# Altium footprint library lib.PcbLib: 145 footprints (part 3 of 10)
Each footprint in its own frame and in the unit in brackets; x right, y up, seen from the top. Pads: shape width x height; smd on the part's side, far side on the other; paste and mask are expansions set on the pad; w line width, h text height; cw(c..) or ccw(c..) is an arc to the next point about the centre after c.
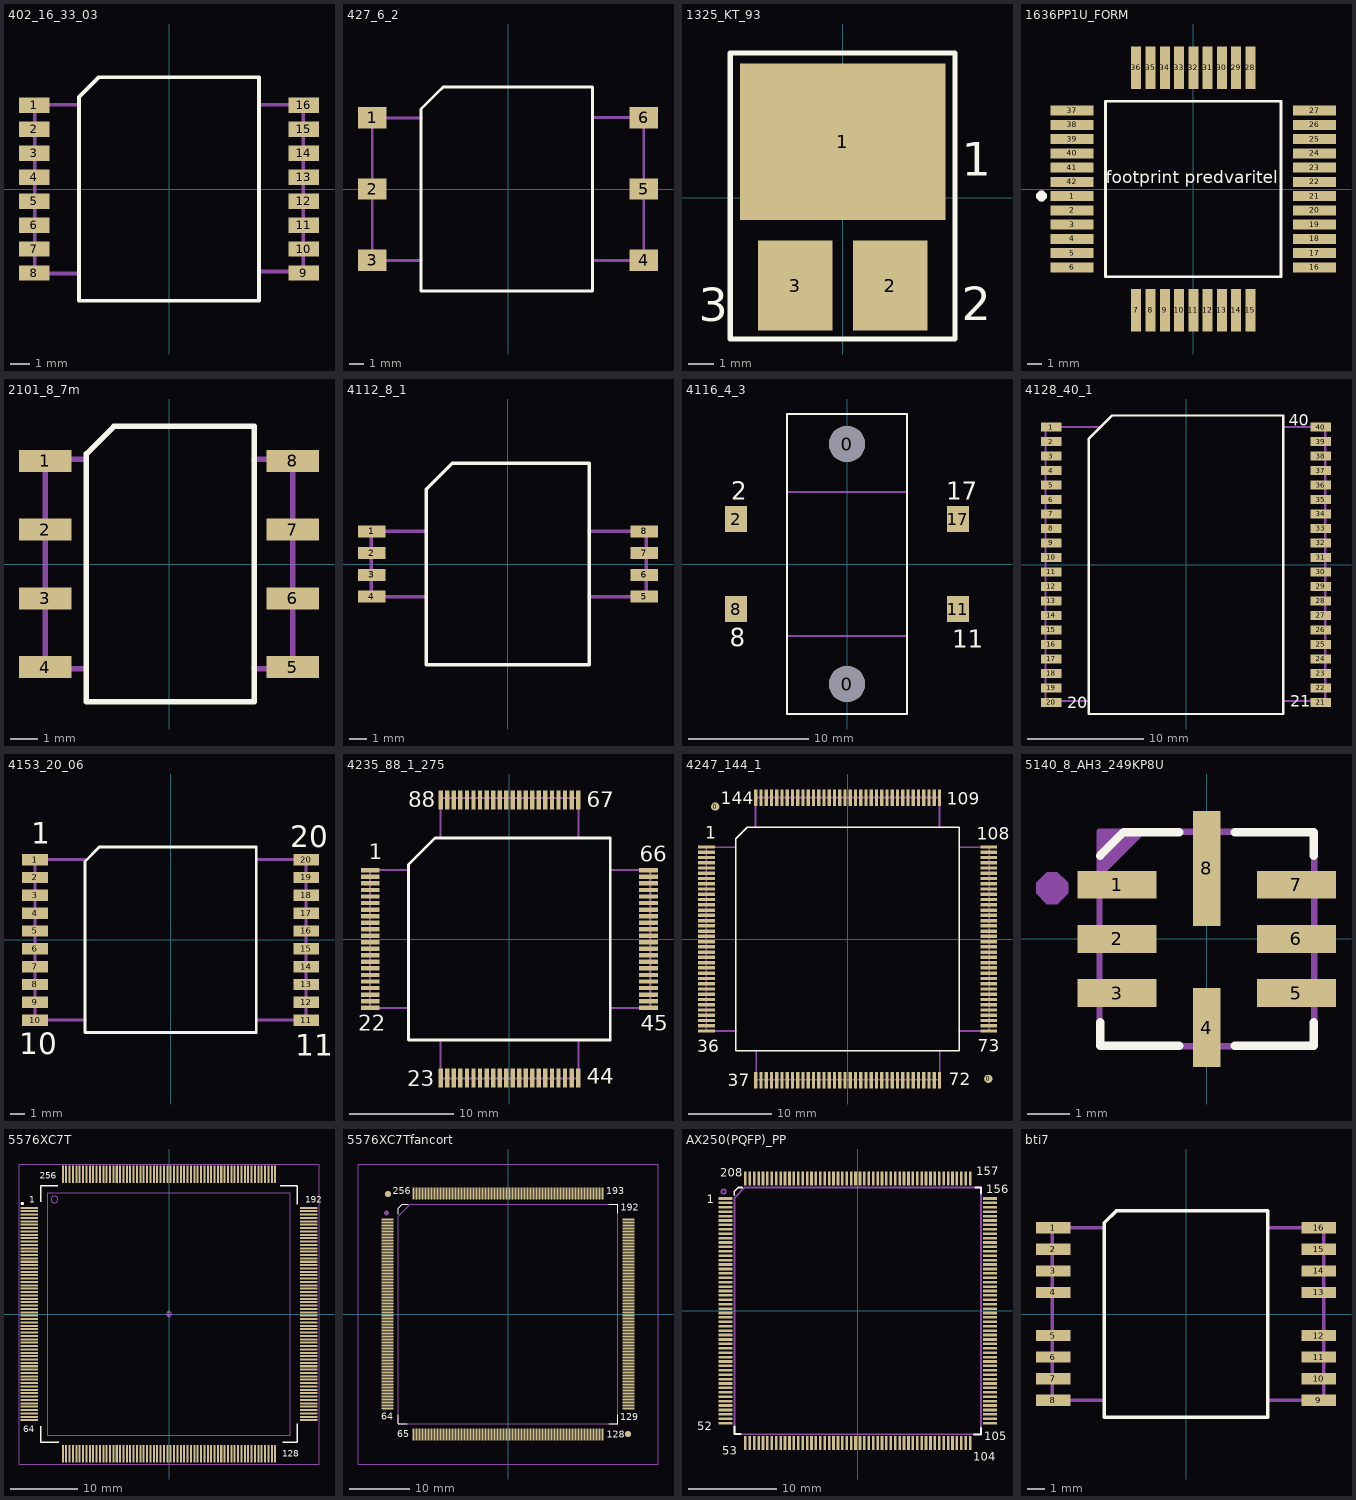
[diagram p2: the footprints below, top view; thin cyan lines are the x and y axes]

## 402_16_33_03 [mm] "m2g"
height 2.5
pads (16):
  rect 1.6x0.8 smd: 1(-7.025,4.375) 2(-7.025,3.125) 3(-7.025,1.875) 4(-7.025,0.625) 5(-7.025,-0.625) 6(-7.025,-1.875) 7(-7.025,-3.125) 8(-7.025,-4.375) 9(7.025,-4.375) 10(7.025,-3.125) 11(7.025,-1.875) 12(7.025,-0.625) 13(7.025,0.625) 14(7.025,1.875) 15(7.025,3.125) 16(7.025,4.375)
Top Overlay:
  lines w0.2: -4.7,-5.825 -4.7,4.8 -3.658,5.842 4.7,5.842 4.7,-5.825 -4.7,-5.825
Mechanical 5:
  lines w0.2: -4.7,-4.4 -7,-4.4 -7,4.4 -4.7,4.4 ; 4.7,-4.3 7,-4.3 7,4.1 7,4.4 4.7,4.4
Mechanical 25:
  text "9" at 5,-5 h2
  text "16" at 4,3.75 h2
  text "8" at -5.75,-5 h2
  text "1" at -5.75,3.75 h2
3D body "CFP125P1440X250-16N.step": height 2.5, standoff 0, extent -7.25,-5.825 7.25,5.825

## 427_6_2 [mm] "286ЕП5"
height 5.6
pads (6):
  rect 2x1.5 smd: 1(-9.5,5) 2(-9.5,0) 3(-9.5,-5) 4(9.5,-5) 5(9.5,0) 6(9.5,5)
Top Overlay:
  lines w0.2: -6.087,-7.15 -6.087,5.6 -5.7,5.988 -4.925,6.763 -4.537,7.15 5.913,7.15 5.913,-7.15 -6.062,-7.15
Mechanical 5:
  lines w0.2: -6.1,-5 -9.5,-5 -9.5,4.975 -6.075,4.975 ; 5.9,5 9.5,5 9.5,-5 5.925,-5
Mechanical 25:
  text "1" at -7.875,4.45 h2
  text "6" at 7.175,4.35 h2
  text "4" at 7,-5.775 h2
  text "3" at -7.925,-5.525 h2

## 1325_KT_93 [mm]
height 3.05
pads (3):
  rect 8x6.1 smd: 1(0,2.175)
  rect 2.9x3.5 smd: 2(1.85,-3.425) 3(-1.85,-3.425)
Top Overlay:
  lines w0.2: -4.375,-5.5 -4.375,-5.125 -4.375,5.625 -4,5.625 4.375,5.625 4.375,5.25 4.375,-5.5 3,-5.5 -4.375,-5.5
  text "3" at -5.6,-4.8 h1.31
  text "2" at 4.625,-4.775 h1.31
  text "1" at 4.625,0.85 h1.31
Top Paste:
  region: -1.5,-0.625 -1.5,1.875 -3.625,1.875 -3.625,-0.625
  region: 1.5,1.875 1.5,-0.625 3.625,-0.625 3.625,1.875
  region: -3.625,2.25 -1.5,2.25 -1.5,4.875 -3.625,4.875
  region: 3.625,2.25 3.625,4.875 1.5,4.875 1.5,2.25
  region: 1.125,-0.625 1.125,1.875 -1.125,1.875 -1.125,-0.625
  region: 1.125,2.25 1.125,4.875 -1.125,4.875 -1.125,2.25
Mechanical 25:
  text "1" at 4.625,2.55 h2
  text "2" at 4.5,-3.2 h2
  text "3" at -5.2,-3.2 h2
3D body: height 0.4, standoff 0, extent -3.65,-0.85 3.65,4.85
3D body: height 0.4, standoff 0, extent -2.95,-4.8 -0.45,-1.7
3D body: height 0.4, standoff 0, extent 0.45,-4.8 2.95,-1.7
3D body: height 2.6, standoff 0.4, extent -3.7,-5.1 3.9,5.1

## 1636PP1U_FORM [mm]
pads (42):
  rect 3x0.7 smd: 1(-8.5,-0.5) 2(-8.5,-1.5) 3(-8.5,-2.5) 4(-8.5,-3.5) 5(-8.5,-4.5) 6(-8.5,-5.5) 16(8.5,-5.5) 17(8.5,-4.5) 18(8.5,-3.5) 19(8.5,-2.5) 20(8.5,-1.5) 21(8.5,-0.5) 22(8.5,0.5) 23(8.5,1.5) 24(8.5,2.5) 25(8.5,3.5) 26(8.5,4.5) 27(8.5,5.5) 37(-8.5,5.5) 38(-8.5,4.5) 39(-8.5,3.5) 40(-8.5,2.5) 41(-8.5,1.5) 42(-8.5,0.5)
  rect 0.7x3 smd: 7(-4,-8.5) 8(-3,-8.5) 9(-2,-8.5) 10(-1,-8.5) 11(0,-8.5) 12(1,-8.5) 13(2,-8.5) 14(3,-8.5) 15(4,-8.5) 28(4,8.5) 29(3,8.5) 30(2,8.5) 31(1,8.5) 32(0,8.5) 33(-1,8.5) 34(-2,8.5) 35(-3,8.5) 36(-4,8.5)
Top Overlay:
  region: -11.025,-0.61 -10.775,-0.86 -10.525,-0.86 -10.275,-0.61 -10.275,-0.36 -10.525,-0.11 -10.775,-0.11 -11.025,-0.36
  lines w0.2: -6.15,-6.15 6.15,-6.15 6.15,6.15 -6.15,6.15 -6.15,-6.15
  text "footprint predvaritel" at -6.15,0.1 h1.5
Mechanical 25:
  region: -11.025,-0.61 -10.775,-0.86 -10.525,-0.86 -10.275,-0.61 -10.275,-0.36 -10.525,-0.11 -10.775,-0.11 -11.025,-0.36
  text "6" at -9.05,-7.75 h2
  text "7" at -6,-9.3 h2
  text "15" at 5,-9.2 h2
  text "16" at 7.725,-8 h2
  text "27" at 7.525,6.225 h2
  text "28" at 4.975,8.1 h2
  text "36" at -6.9,8.05 h2
  text "37" at -9.625,6.25 h2
  text "1" at -11.725,-1.175 h2

## 2101_8_7m [mm]
height 5.5
pads (8):
  rect 1.9x0.8 smd: 1(-4.5,3.75) 2(-4.5,1.25) 3(-4.5,-1.25) 4(-4.5,-3.75) 5(4.5,-3.75) 6(4.5,-1.25) 7(4.5,1.25) 8(4.5,3.75)
Top Overlay:
  lines w0.2: -3,-5 3.1,-5 3.1,5 -2,5 -3,4 -3,-5
Mechanical 5:
  lines w0.2: -3.1,-3.8 -4.5,-3.8 -4.5,3.8 -3.1,3.8 ; 3.1,-3.8 4.5,-3.8 4.5,3.8 3.1,3.8
Mechanical 25:
  text "8" at 2.25,3.25 h2
  text "1" at -3,3.25 h2
  text "4" at -3.25,-4.25 h2
  text "5" at 2.25,-4.25 h2
3D body "2101_8_7m.stp": height 5.6, standoff -0.15, extent -4.875,-5 4.925,5

## 4112_8_1 [mm] "34;44.3276.163.12   (ОСМ5559ИН2АТ???????)"
height 2.45
pads (8):
  rect 1.6x0.7 smd: 1(-7.85,1.875) 2(-7.85,0.625) 3(-7.85,-0.625) 4(-7.85,-1.875) 5(7.85,-1.875) 6(7.85,-0.625) 7(7.85,0.625) 8(7.85,1.875)
Top Overlay:
  lines w0.2: -4.725,-5.8 -4.725,4.3 -3.225,5.8 4.675,5.8 4.675,-5.8 -4.725,-5.8
Mechanical 5:
  lines w0.2: -7.925,-1.9 -4.725,-1.9 ; -7.925,1.9 -4.725,1.9 ; -7.875,-1.9 -7.875,1.9 ; 4.675,-1.9 7.975,-1.9 7.975,1.9 4.675,1.9
Mechanical 25:
  text "8" at 5.575,1 h3
  text "5" at 5.575,-2.9 h3
  text "4" at -6.725,-2.9 h3
  text "1" at -6.625,0.9 h3

## 4116_4_3 [mm] "Install 35 massa 3 form 44.3242.193.xx"
height 3.35
pads (6):
  round 3 hole 3 unplated: 0(0,-10) 0(0,10)
  rect 1.8x2.2 smd: 2(-9.25,3.75) 8(-9.25,-3.75) 11(9.25,-3.75) 17(9.25,3.75)
Top Overlay:
  lines w0.2: -5,-12.5 -5,12.5 5,12.5 5,-12.5 -5,-12.5
  text "8" at -9.779,-6.858 h1.5
  text "2" at -9.652,5.334 h1.5
  text "11" at 8.763,-6.985 h1.5
  text "17" at 8.255,5.334 h1.5
Top Solder:
  circle w1.5: c0,-10 r0.75
  circle w1.5: c0,10 r0.75
Bottom Solder:
  circle w1.5: c0,-10 r0.75
  circle w1.5: c0,10 r0.75
Mechanical 5:
  lines w0.2: -5,5.9 -5,-6 5,-6 ; -5,6 5,6 5,-5.9
Mechanical 25:
  text "17" at 6.2,3.2 h2
  text "2" at -7.625,3.175 h2
  text "8" at -7.625,-4.35 h2
  text "11" at 6.2,-4.6 h2

## 4128_40_1 [mm] "1667PA014, 44.0000.238.16???"
height 3.1
pads (40):
  rect 1.8x0.8 smd: 1(-11.625,11.875) 2(-11.625,10.625) 3(-11.625,9.375) 4(-11.625,8.125) 5(-11.625,6.875) 6(-11.625,5.625) 7(-11.625,4.375) 8(-11.625,3.125) 9(-11.625,1.875) 10(-11.625,0.625) 11(-11.625,-0.625) 12(-11.625,-1.875) 13(-11.625,-3.125) 14(-11.625,-4.375) 15(-11.625,-5.625) 16(-11.625,-6.875) 17(-11.625,-8.125) 18(-11.625,-9.375) 19(-11.625,-10.625) 20(-11.625,-11.875) 21(11.625,-11.875) 22(11.625,-10.625) 23(11.625,-9.375) 24(11.625,-8.125) 25(11.625,-6.875) 26(11.625,-5.625) 27(11.625,-4.375) 28(11.625,-3.125) 29(11.625,-1.875) 30(11.625,-0.625) 31(11.625,0.625) 32(11.625,1.875) 33(11.625,3.125) 34(11.625,4.375) 35(11.625,5.625) 36(11.625,6.875) 37(11.625,8.125) 38(11.625,9.375) 39(11.625,10.625) 40(11.625,11.875)
Top Overlay:
  lines w0.2: -8.375,-12.875 -8.375,10.875 -6.375,12.875 8.375,12.875 8.375,-12.875 -8.375,-12.875
  text "21" at 9,-12.25 h1
  text "40" at 8.875,12 h1
  text "20" at -10.25,-12.375 h1
Mechanical 5:
  lines w0.2: -8.375,-11.75 -12.125,-11.75 -12.125,11.875 -7.5,11.875 ; 8.375,-11.75 12,-11.75 12,11.875 8.5,11.875
Mechanical 25:
  text "40" at 8.625,11.375 h2
  text "21" at 8.625,-12.375 h2
  text "20" at -10.25,-12.375 h2
  text "1" at -9.8,11.2 h2
3D body "CFP125P2370X310-40N.step": height 3.1, standoff 0, extent -11.9,-12.7 11.9,12.7

## 4153_20_06 [mm] "1564ИР33Т ЭП"
height 3
pads (20):
  rect 1.8x0.8 smd: 1(-9.5,5.625) 2(-9.5,4.375) 3(-9.5,3.125) 4(-9.5,1.875) 5(-9.5,0.625) 6(-9.5,-0.625) 7(-9.5,-1.875) 8(-9.5,-3.125) 9(-9.5,-4.375) 10(-9.5,-5.625) 11(9.5,-5.625) 12(9.5,-4.375) 13(9.5,-3.125) 14(9.5,-1.875) 15(9.5,-0.625) 16(9.5,0.625) 17(9.5,1.875) 18(9.5,3.125) 19(9.5,4.375) 20(9.5,5.625)
Top Overlay:
  lines w0.2: -6,-6.5 -6,5.5 -5,6.5 6,6.5 6,-6.5 -6,-6.5
  text "20" at 8.375,6.5 h1.5
  text "11" at 8.75,-8.125 h1.5
  text "10" at -10.625,-8 h1.5
  text "1" at -9.75,6.75 h1.5
Mechanical 5:
  lines w0.2: -6,-5.625 -9.5,-5.625 -9.5,5.625 -6,5.625 ; 6,-5.625 9.5,-5.625 9.5,5.625 6,5.625
Mechanical 25:
  text "20" at 6.2,4.975 h2
  text "11" at 6.45,-6.325 h2
  text "10" at -7.875,-6.25 h2
  text "1" at -7.675,4.95 h2
3D body "CFP125P1920X300-20N.step": height 3, standoff 0, extent -9.65,-6.5 9.65,6.5

## 4235_88_1_275 [mm] "1874ВЕ7Т   m4.5g"
height 3.1
pads (88):
  rect 1.8x0.42 smd: 1(-13.3,6.562) 2(-13.3,5.937) 3(-13.3,5.312) 4(-13.3,4.687) 5(-13.3,4.062) 6(-13.3,3.437) 7(-13.3,2.812) 8(-13.3,2.187) 9(-13.3,1.562) 10(-13.3,0.937) 11(-13.3,0.312) 12(-13.3,-0.312) 13(-13.3,-0.937) 14(-13.3,-1.562) 15(-13.3,-2.187) 16(-13.3,-2.812) 17(-13.3,-3.437) 18(-13.3,-4.062) 19(-13.3,-4.687) 20(-13.3,-5.312) 21(-13.3,-5.937) 22(-13.3,-6.562) 45(13.3,-6.562) 46(13.3,-5.937) 47(13.3,-5.312) 48(13.3,-4.687) 49(13.3,-4.062) 50(13.3,-3.437) 51(13.3,-2.812) 52(13.3,-2.187) 53(13.3,-1.562) 54(13.3,-0.937) 55(13.3,-0.312) 56(13.3,0.312) 57(13.3,0.937) 58(13.3,1.562) 59(13.3,2.187) 60(13.3,2.812) 61(13.3,3.437) 62(13.3,4.062) 63(13.3,4.687) 64(13.3,5.312) 65(13.3,5.937) 66(13.3,6.562)
  rect 0.42x1.8 smd: 23(-6.562,-13.3) 24(-5.937,-13.3) 25(-5.312,-13.3) 26(-4.687,-13.3) 27(-4.062,-13.3) 28(-3.437,-13.3) 29(-2.812,-13.3) 30(-2.187,-13.3) 31(-1.562,-13.3) 32(-0.937,-13.3) 33(-0.312,-13.3) 34(0.312,-13.3) 35(0.937,-13.3) 36(1.562,-13.3) 37(2.187,-13.3) 38(2.812,-13.3) 39(3.437,-13.3) 40(4.062,-13.3) 41(4.687,-13.3) 42(5.312,-13.3) 43(5.937,-13.3) 44(6.562,-13.3) 67(6.562,13.3) 68(5.937,13.3) 69(5.312,13.3) 70(4.687,13.3) 71(4.062,13.3) 72(3.437,13.3) 73(2.812,13.3) 74(2.187,13.3) 75(1.562,13.3) 76(0.937,13.3) 77(0.312,13.3) 78(-0.312,13.3) 79(-0.937,13.3) 80(-1.562,13.3) 81(-2.187,13.3) 82(-2.812,13.3) 83(-3.437,13.3) 84(-4.062,13.3) 85(-4.687,13.3) 86(-5.312,13.3) 87(-5.937,13.3) 88(-6.562,13.3)
Top Overlay:
  lines w0.25: -9.65,-9.65 -9.65,7.114 -7.114,9.65 9.65,9.65 9.65,-9.65 -9.65,-9.65
  text "23" at -9.779,-14.097 h1.5
  text "88" at -9.652,12.573 h1.5
  text "44" at 7.366,-13.843 h1.5
  text "67" at 7.366,12.573 h1.5
  text "1" at -13.462,7.62 h1.5
  text "45" at 12.573,-8.763 h1.5
  text "66" at 12.446,7.366 h1.5
  text "22" at -14.478,-8.763 h1.5
Mechanical 5:
  lines w0.2: -9.652,-6.604 -13.335,-6.604 -13.335,6.604 -9.652,6.604 ; -6.604,-9.652 -6.604,-13.335 6.604,-13.335 6.604,-9.652 ; -6.604,9.652 -6.604,13.462 6.604,13.462 6.604,9.652 ; 9.652,-6.604 13.462,-6.604 13.462,6.604 9.652,6.604
Mechanical 25:
  text "22" at -14.351,-8.509 h2
  text "66" at 12.573,7.62 h2
  text "45" at 12.7,-8.509 h2
  text "1" at -13.335,7.874 h2
  text "67" at 7.493,12.827 h2
  text "44" at 7.493,-13.589 h2
  text "88" at -9.525,12.827 h2
  text "23" at -9.652,-13.843 h2
3D body "CQFP127P600-8N.step": height 3.1, standoff 0, extent -13.75,-13.75 13.75,13.75

## 4247_144_1 [mm] "35а;44ж.3803.346.60;"
height 3.3
pads (146):
  round 1 smd mask+1: 0(-16,16) 0(17,-16.9)
  rect 2x0.4 smd: 1(-17.05,11.112) 2(-17.05,10.477) 3(-17.05,9.842) 4(-17.05,9.207) 5(-17.05,8.572) 6(-17.05,7.938) 7(-17.05,7.302) 8(-17.05,6.667) 9(-17.05,6.032) 10(-17.05,5.397) 11(-17.05,4.763) 12(-17.05,4.127) 13(-17.05,3.492) 14(-17.05,2.857) 15(-17.05,2.222) 16(-17.05,1.587) 17(-17.05,0.953) 18(-17.05,0.318) 19(-17.05,-0.318) 20(-17.05,-0.953) 21(-17.05,-1.587) 22(-17.05,-2.222) 23(-17.05,-2.857) 24(-17.05,-3.492) 25(-17.05,-4.127) 26(-17.05,-4.763) 27(-17.05,-5.397) 28(-17.05,-6.032) 29(-17.05,-6.667) 30(-17.05,-7.302) 31(-17.05,-7.938) 32(-17.05,-8.572) 33(-17.05,-9.207) 34(-17.05,-9.842) 35(-17.05,-10.477) 36(-17.05,-11.112) 73(17.05,-11.112) 74(17.05,-10.477) 75(17.05,-9.842) 76(17.05,-9.207) 77(17.05,-8.572) 78(17.05,-7.938) 79(17.05,-7.302) 80(17.05,-6.667) 81(17.05,-6.032) 82(17.05,-5.397) 83(17.05,-4.763) 84(17.05,-4.127) 85(17.05,-3.492) 86(17.05,-2.857) 87(17.05,-2.222) 88(17.05,-1.587) 89(17.05,-0.953) 90(17.05,-0.318) 91(17.05,0.318) 92(17.05,0.953) 93(17.05,1.587) 94(17.05,2.222) 95(17.05,2.857) 96(17.05,3.492) 97(17.05,4.127) 98(17.05,4.763) 99(17.05,5.397) 100(17.05,6.032) 101(17.05,6.667) 102(17.05,7.302) 103(17.05,7.938) 104(17.05,8.572) 105(17.05,9.207) 106(17.05,9.842) 107(17.05,10.477) 108(17.05,11.112)
  rect 0.4x2 smd: 37(-11.112,-17.05) 38(-10.477,-17.05) 39(-9.842,-17.05) 40(-9.207,-17.05) 41(-8.572,-17.05) 42(-7.938,-17.05) 43(-7.302,-17.05) 44(-6.667,-17.05) 45(-6.032,-17.05) 46(-5.397,-17.05) 47(-4.763,-17.05) 48(-4.127,-17.05) 49(-3.492,-17.05) 50(-2.857,-17.05) 51(-2.222,-17.05) 52(-1.587,-17.05) 53(-0.953,-17.05) 54(-0.318,-17.05) 55(0.318,-17.05) 56(0.953,-17.05) 57(1.587,-17.05) 58(2.222,-17.05) 59(2.857,-17.05) 60(3.492,-17.05) 61(4.127,-17.05) 62(4.763,-17.05) 63(5.397,-17.05) 64(6.032,-17.05) 65(6.667,-17.05) 66(7.302,-17.05) 67(7.938,-17.05) 68(8.572,-17.05) 69(9.207,-17.05) 70(9.842,-17.05) 71(10.477,-17.05) 72(11.112,-17.05) 109(11.112,17.05) 110(10.477,17.05) 111(9.842,17.05) 112(9.207,17.05) 113(8.572,17.05) 114(7.938,17.05) 115(7.302,17.05) 116(6.667,17.05) 117(6.032,17.05) 118(5.397,17.05) 119(4.763,17.05) 120(4.127,17.05) 121(3.492,17.05) 122(2.857,17.05) 123(2.222,17.05) 124(1.587,17.05) 125(0.953,17.05) 126(0.318,17.05) 127(-0.318,17.05) 128(-0.953,17.05) 129(-1.587,17.05) 130(-2.222,17.05) 131(-2.857,17.05) 132(-3.492,17.05) 133(-4.127,17.05) 134(-4.763,17.05) 135(-5.397,17.05) 136(-6.032,17.05) 137(-6.667,17.05) 138(-7.302,17.05) 139(-7.938,17.05) 140(-8.572,17.05) 141(-9.207,17.05) 142(-9.842,17.05) 143(-10.477,17.05) 144(-11.112,17.05)
Top Overlay:
  lines w0.2: -13.5,-13.5 -13.5,12.125 -12.125,13.5 13.5,13.5 13.5,-13.5 -13.5,-13.5
  text "1" at -17.2,12.1 h1.5
  text "36" at -18.2,-13.7 h1.5
  text "37" at -14.5,-17.8 h1.5
  text "72" at 12.2,-17.7 h1.5
  text "73" at 15.7,-13.6 h1.5
  text "108" at 15.6,12 h1.5
  text "109" at 12,16.2 h1.5
  text "144" at -15.3,16.3 h1.5
Mechanical 5:
  lines w0.2: -13.525,11.1 -17.075,11.1 ; -13.5,-11.125 -17.075,-11.125 -17.075,11.1 ; -11.125,13.575 -11.125,17.1 11.125,17.1 11.1,17.075 11.1,13.5 ; -11.05,-13.487 -11.05,-16.987 11.15,-16.987 11.15,-13.487 ; 13.5,-11.125 17.075,-11.125 17.1,-11.1 17.1,11.1 13.5,11.1 ; -17.075,11.1 -17.075,11.1
Mechanical 25:
  text "1" at -15.2,10.4 h2
  text "36" at -15.2,-11.5 h2
  text "37" at -11.9,-15 h2
  text "72" at 10.3,-15.4 h2
  text "73" at 13.2,-11.7 h2
  text "108" at 12.7,10.5 h2
  text "109" at 10,14.2 h2
  text "144" at -12.3,14 h2
3D body "CQFP127P600-8N.step": height 3.1, standoff 0, extent -17.3,-17.3 17.3,17.3

## 5140_8_AH3_249KP8U [mm]
height 1.95
pads (8):
  rect 1.85x0.65 smd: 1(-2.1,1.27) 2(-2.1,0) 3(-2.1,-1.27) 5(2.1,-1.27) 6(2.1,0) 7(2.1,1.27)
  rect 0.65x1.85 smd: 4(0,-2.08)
  rect 0.65x2.7 smd: 8(0,1.65)
Top Overlay:
  lines w0.2: -2.5,-1.95 -2.5,-2.5 -0.65,-2.5 ; -2.5,1.95 -1.95,2.5 -0.65,2.5 ; 0.65,-2.5 2.5,-2.5 2.5,-1.95 ; 0.65,2.5 2.5,2.5 2.5,1.95
Mechanical 5:
  lines w0.15: -2.513,-2.513 -2.513,2.513 2.513,2.513 2.513,-2.513 -2.513,-2.513 ; -2.513,1.513 -1.513,2.513 -2.513,1.513 ; -2.513,1.612 -1.612,2.513 -2.513,1.612 ; -2.513,1.712 -1.712,2.513 -2.513,1.712 ; -2.513,1.812 -1.812,2.513 -2.513,1.812 ; -2.513,1.913 -1.913,2.513 -2.513,1.913 ; -2.513,2.013 -2.013,2.513 -2.513,2.013 ; -2.513,2.112 -2.112,2.513 -2.513,2.112 ; -2.513,2.213 -2.213,2.513 -2.513,2.213 ; -2.513,2.312 -2.312,2.513 -2.513,2.312 ; -2.513,2.412 -2.412,2.513 -2.513,2.412
Mechanical 25:
  region: -4,1.065 -3.75,0.815 -3.5,0.815 -3.25,1.065 -3.25,1.315 -3.5,1.565 -3.75,1.565 -4,1.315
  text "8" at -0.4,3.2 h2
3D body: height 2, standoff 0, extent -0.325,-2.6 0.325,-2.5
3D body: height 2, standoff 0, extent -0.325,2.5 0.325,2.6
3D body: height 2, standoff 0, extent 2.5,-1.6 2.6,-0.95
3D body: height 2, standoff 0, extent 2.5,-0.325 2.6,0.325
3D body: height 2, standoff 0, extent 2.5,0.95 2.6,1.6
3D body: height 2, standoff 0, extent -2.6,-1.6 -2.5,-0.95
3D body: height 2, standoff 0, extent -2.6,-0.325 -2.5,0.325
3D body: height 2, standoff 0, extent -2.6,0.95 -2.5,1.6
3D body: height 2, standoff 0, extent -2.5,-2.5 2.5,2.5

## 5576XC7T [mm]
pads (256):
  rect 2.6x0.3 smd: 1(-20.7,15.75) 2(-20.7,15.25) 3(-20.7,14.75) 4(-20.7,14.25) 5(-20.7,13.75) 6(-20.7,13.25) 7(-20.7,12.75) 8(-20.7,12.25) 9(-20.7,11.75) 10(-20.7,11.25) 11(-20.7,10.75) 12(-20.7,10.25) 13(-20.7,9.75) 14(-20.7,9.25) 15(-20.7,8.75) 16(-20.7,8.25) 17(-20.7,7.75) 18(-20.7,7.25) 19(-20.7,6.75) 20(-20.7,6.25) 21(-20.7,5.75) 22(-20.7,5.25) 23(-20.7,4.75) 24(-20.7,4.25) 25(-20.7,3.75) 26(-20.7,3.25) 27(-20.7,2.75) 28(-20.7,2.25) 29(-20.7,1.75) 30(-20.7,1.25) 31(-20.7,0.75) 32(-20.7,0.25) 33(-20.7,-0.25) 34(-20.7,-0.75) 35(-20.7,-1.25) 36(-20.7,-1.75) 37(-20.7,-2.25) 38(-20.7,-2.75) 39(-20.7,-3.25) 40(-20.7,-3.75) 41(-20.7,-4.25) 42(-20.7,-4.75) 43(-20.7,-5.25) 44(-20.7,-5.75) 45(-20.7,-6.25) 46(-20.7,-6.75) 47(-20.7,-7.25) 48(-20.7,-7.75) 49(-20.7,-8.25) 50(-20.7,-8.75) 51(-20.7,-9.25) 52(-20.7,-9.75) 53(-20.7,-10.25) 54(-20.7,-10.75) 55(-20.7,-11.25) 56(-20.7,-11.75) 57(-20.7,-12.25) 58(-20.7,-12.75) 59(-20.7,-13.25) 60(-20.7,-13.75) 61(-20.7,-14.25) 62(-20.7,-14.75) 63(-20.7,-15.25) 64(-20.7,-15.75) 129(20.7,-15.75) 130(20.7,-15.25) 131(20.7,-14.75) 132(20.7,-14.25) 133(20.7,-13.75) 134(20.7,-13.25) 135(20.7,-12.75) 136(20.7,-12.25) 137(20.7,-11.75) 138(20.7,-11.25) 139(20.7,-10.75) 140(20.7,-10.25) 141(20.7,-9.75) 142(20.7,-9.25) 143(20.7,-8.75) 144(20.7,-8.25) 145(20.7,-7.75) 146(20.7,-7.25) 147(20.7,-6.75) 148(20.7,-6.25) 149(20.7,-5.75) 150(20.7,-5.25) 151(20.7,-4.75) 152(20.7,-4.25) 153(20.7,-3.75) 154(20.7,-3.25) 155(20.7,-2.75) 156(20.7,-2.25) 157(20.7,-1.75) 158(20.7,-1.25) 159(20.7,-0.75) 160(20.7,-0.25) 161(20.7,0.25) 162(20.7,0.75) 163(20.7,1.25) 164(20.7,1.75) 165(20.7,2.25) 166(20.7,2.75) 167(20.7,3.25) 168(20.7,3.75) 169(20.7,4.25) 170(20.7,4.75) 171(20.7,5.25) 172(20.7,5.75) 173(20.7,6.25) 174(20.7,6.75) 175(20.7,7.25) 176(20.7,7.75) 177(20.7,8.25) 178(20.7,8.75) 179(20.7,9.25) 180(20.7,9.75) 181(20.7,10.25) 182(20.7,10.75) 183(20.7,11.25) 184(20.7,11.75) 185(20.7,12.25) 186(20.7,12.75) 187(20.7,13.25) 188(20.7,13.75) 189(20.7,14.25) 190(20.7,14.75) 191(20.7,15.25) 192(20.7,15.75)
  rect 0.3x2.6 smd: 65(-15.75,-20.7) 66(-15.25,-20.7) 67(-14.75,-20.7) 68(-14.25,-20.7) 69(-13.75,-20.7) 70(-13.25,-20.7) 71(-12.75,-20.7) 72(-12.25,-20.7) 73(-11.75,-20.7) 74(-11.25,-20.7) 75(-10.75,-20.7) 76(-10.25,-20.7) 77(-9.75,-20.7) 78(-9.25,-20.7) 79(-8.75,-20.7) 80(-8.25,-20.7) 81(-7.75,-20.7) 82(-7.25,-20.7) 83(-6.75,-20.7) 84(-6.25,-20.7) 85(-5.75,-20.7) 86(-5.25,-20.7) 87(-4.75,-20.7) 88(-4.25,-20.7) 89(-3.75,-20.7) 90(-3.25,-20.7) 91(-2.75,-20.7) 92(-2.25,-20.7) 93(-1.75,-20.7) 94(-1.25,-20.7) 95(-0.75,-20.7) 96(-0.25,-20.7) 97(0.25,-20.7) 98(0.75,-20.7) 99(1.25,-20.7) 100(1.75,-20.7) 101(2.25,-20.7) 102(2.75,-20.7) 103(3.25,-20.7) 104(3.75,-20.7) 105(4.25,-20.7) 106(4.75,-20.7) 107(5.25,-20.7) 108(5.75,-20.7) 109(6.25,-20.7) 110(6.75,-20.7) 111(7.25,-20.7) 112(7.75,-20.7) 113(8.25,-20.7) 114(8.75,-20.7) 115(9.25,-20.7) 116(9.75,-20.7) 117(10.25,-20.7) 118(10.75,-20.7) 119(11.25,-20.7) 120(11.75,-20.7) 121(12.25,-20.7) 122(12.75,-20.7) 123(13.25,-20.7) 124(13.75,-20.7) 125(14.25,-20.7) 126(14.75,-20.7) 127(15.25,-20.7) 128(15.75,-20.7) 193(15.75,20.7) 194(15.25,20.7) 195(14.75,20.7) 196(14.25,20.7) 197(13.75,20.7) 198(13.25,20.7) 199(12.75,20.7) 200(12.25,20.7) 201(11.75,20.7) 202(11.25,20.7) 203(10.75,20.7) 204(10.25,20.7) 205(9.75,20.7) 206(9.25,20.7) 207(8.75,20.7) 208(8.25,20.7) 209(7.75,20.7) 210(7.25,20.7) 211(6.75,20.7) 212(6.25,20.7) 213(5.75,20.7) 214(5.25,20.7) 215(4.75,20.7) 216(4.25,20.7) 217(3.75,20.7) 218(3.25,20.7) 219(2.75,20.7) 220(2.25,20.7) 221(1.75,20.7) 222(1.25,20.7) 223(0.75,20.7) 224(0.25,20.7) 225(-0.25,20.7) 226(-0.75,20.7) 227(-1.25,20.7) 228(-1.75,20.7) 229(-2.25,20.7) 230(-2.75,20.7) 231(-3.25,20.7) 232(-3.75,20.7) 233(-4.25,20.7) 234(-4.75,20.7) 235(-5.25,20.7) 236(-5.75,20.7) 237(-6.25,20.7) 238(-6.75,20.7) 239(-7.25,20.7) 240(-7.75,20.7) 241(-8.25,20.7) 242(-8.75,20.7) 243(-9.25,20.7) 244(-9.75,20.7) 245(-10.25,20.7) 246(-10.75,20.7) 247(-11.25,20.7) 248(-11.75,20.7) 249(-12.25,20.7) 250(-12.75,20.7) 251(-13.25,20.7) 252(-13.75,20.7) 253(-14.25,20.7) 254(-14.75,20.7) 255(-15.25,20.7) 256(-15.75,20.7)
Top Overlay:
  circle w0.25: c-21.75,16.4 r0.125
  lines w0.2: -19.05,-16.637 -19.05,-19.05 -16.383,-19.05 ; -19.05,16.637 -19.05,19.05 -16.51,19.05 ; 16.51,19.05 19.05,19.05 19.05,16.256 ; 16.891,-19.05 19.05,-19.05 19.05,-16.256
  text "1" at -20.701,16.51 h1
  text "256" at -19.177,20.066 h1
  text "192" at 20.193,16.51 h1
  text "128" at 16.764,-21.209 h1
  text "64" at -21.59,-17.526 h1
Mechanical 5:
  circle w0.1: c-17,17 r0.5
  lines w0.1: -18,-18 -18,18 18,18 18,-18 -18,-18
Mechanical 16:
  circle w0.05: c0,0 r0.35
  lines w0.05: -0.5,0 0.5,0 ; 0,-0.5 0,0.5 ; -22.25,-22.25 22.25,-22.25 22.25,22.25 -22.25,22.25 -22.25,-22.25
Mechanical 25:
  text "64" at -21.79,-17.426 h2
  text "128" at 16.564,-21.109 h2
  text "192" at 19.993,16.61 h2
  text "256" at -19.377,20.166 h2
  text "1" at -20.901,16.61 h2

## 5576XC7Tfancort [mm]
height 3.3
pads (258):
  round 1 smd mask+1: 0(-20,20) 0(20,-20)
  rect 2x0.3 smd: 1(-20.05,15.75) 2(-20.05,15.25) 3(-20.05,14.75) 4(-20.05,14.25) 5(-20.05,13.75) 6(-20.05,13.25) 7(-20.05,12.75) 8(-20.05,12.25) 9(-20.05,11.75) 10(-20.05,11.25) 11(-20.05,10.75) 12(-20.05,10.25) 13(-20.05,9.75) 14(-20.05,9.25) 15(-20.05,8.75) 16(-20.05,8.25) 17(-20.05,7.75) 18(-20.05,7.25) 19(-20.05,6.75) 20(-20.05,6.25) 21(-20.05,5.75) 22(-20.05,5.25) 23(-20.05,4.75) 24(-20.05,4.25) 25(-20.05,3.75) 26(-20.05,3.25) 27(-20.05,2.75) 28(-20.05,2.25) 29(-20.05,1.75) 30(-20.05,1.25) 31(-20.05,0.75) 32(-20.05,0.25) 33(-20.05,-0.25) 34(-20.05,-0.75) 35(-20.05,-1.25) 36(-20.05,-1.75) 37(-20.05,-2.25) 38(-20.05,-2.75) 39(-20.05,-3.25) 40(-20.05,-3.75) 41(-20.05,-4.25) 42(-20.05,-4.75) 43(-20.05,-5.25) 44(-20.05,-5.75) 45(-20.05,-6.25) 46(-20.05,-6.75) 47(-20.05,-7.25) 48(-20.05,-7.75) 49(-20.05,-8.25) 50(-20.05,-8.75) 51(-20.05,-9.25) 52(-20.05,-9.75) 53(-20.05,-10.25) 54(-20.05,-10.75) 55(-20.05,-11.25) 56(-20.05,-11.75) 57(-20.05,-12.25) 58(-20.05,-12.75) 59(-20.05,-13.25) 60(-20.05,-13.75) 61(-20.05,-14.25) 62(-20.05,-14.75) 63(-20.05,-15.25) 64(-20.05,-15.75) 129(20.05,-15.75) 130(20.05,-15.25) 131(20.05,-14.75) 132(20.05,-14.25) 133(20.05,-13.75) 134(20.05,-13.25) 135(20.05,-12.75) 136(20.05,-12.25) 137(20.05,-11.75) 138(20.05,-11.25) 139(20.05,-10.75) 140(20.05,-10.25) 141(20.05,-9.75) 142(20.05,-9.25) 143(20.05,-8.75) 144(20.05,-8.25) 145(20.05,-7.75) 146(20.05,-7.25) 147(20.05,-6.75) 148(20.05,-6.25) 149(20.05,-5.75) 150(20.05,-5.25) 151(20.05,-4.75) 152(20.05,-4.25) 153(20.05,-3.75) 154(20.05,-3.25) 155(20.05,-2.75) 156(20.05,-2.25) 157(20.05,-1.75) 158(20.05,-1.25) 159(20.05,-0.75) 160(20.05,-0.25) 161(20.05,0.25) 162(20.05,0.75) 163(20.05,1.25) 164(20.05,1.75) 165(20.05,2.25) 166(20.05,2.75) 167(20.05,3.25) 168(20.05,3.75) 169(20.05,4.25) 170(20.05,4.75) 171(20.05,5.25) 172(20.05,5.75) 173(20.05,6.25) 174(20.05,6.75) 175(20.05,7.25) 176(20.05,7.75) 177(20.05,8.25) 178(20.05,8.75) 179(20.05,9.25) 180(20.05,9.75) 181(20.05,10.25) 182(20.05,10.75) 183(20.05,11.25) 184(20.05,11.75) 185(20.05,12.25) 186(20.05,12.75) 187(20.05,13.25) 188(20.05,13.75) 189(20.05,14.25) 190(20.05,14.75) 191(20.05,15.25) 192(20.05,15.75)
  rect 0.3x2 smd: 65(-15.75,-20.05) 66(-15.25,-20.05) 67(-14.75,-20.05) 68(-14.25,-20.05) 69(-13.75,-20.05) 70(-13.25,-20.05) 71(-12.75,-20.05) 72(-12.25,-20.05) 73(-11.75,-20.05) 74(-11.25,-20.05) 75(-10.75,-20.05) 76(-10.25,-20.05) 77(-9.75,-20.05) 78(-9.25,-20.05) 79(-8.75,-20.05) 80(-8.25,-20.05) 81(-7.75,-20.05) 82(-7.25,-20.05) 83(-6.75,-20.05) 84(-6.25,-20.05) 85(-5.75,-20.05) 86(-5.25,-20.05) 87(-4.75,-20.05) 88(-4.25,-20.05) 89(-3.75,-20.05) 90(-3.25,-20.05) 91(-2.75,-20.05) 92(-2.25,-20.05) 93(-1.75,-20.05) 94(-1.25,-20.05) 95(-0.75,-20.05) 96(-0.25,-20.05) 97(0.25,-20.05) 98(0.75,-20.05) 99(1.25,-20.05) 100(1.75,-20.05) 101(2.25,-20.05) 102(2.75,-20.05) 103(3.25,-20.05) 104(3.75,-20.05) 105(4.25,-20.05) 106(4.75,-20.05) 107(5.25,-20.05) 108(5.75,-20.05) 109(6.25,-20.05) 110(6.75,-20.05) 111(7.25,-20.05) 112(7.75,-20.05) 113(8.25,-20.05) 114(8.75,-20.05) 115(9.25,-20.05) 116(9.75,-20.05) 117(10.25,-20.05) 118(10.75,-20.05) 119(11.25,-20.05) 120(11.75,-20.05) 121(12.25,-20.05) 122(12.75,-20.05) 123(13.25,-20.05) 124(13.75,-20.05) 125(14.25,-20.05) 126(14.75,-20.05) 127(15.25,-20.05) 128(15.75,-20.05) 193(15.75,20.05) 194(15.25,20.05) 195(14.75,20.05) 196(14.25,20.05) 197(13.75,20.05) 198(13.25,20.05) 199(12.75,20.05) 200(12.25,20.05) 201(11.75,20.05) 202(11.25,20.05) 203(10.75,20.05) 204(10.25,20.05) 205(9.75,20.05) 206(9.25,20.05) 207(8.75,20.05) 208(8.25,20.05) 209(7.75,20.05) 210(7.25,20.05) 211(6.75,20.05) 212(6.25,20.05) 213(5.75,20.05) 214(5.25,20.05) 215(4.75,20.05) 216(4.25,20.05) 217(3.75,20.05) 218(3.25,20.05) 219(2.75,20.05) 220(2.25,20.05) 221(1.75,20.05) 222(1.25,20.05) 223(0.75,20.05) 224(0.25,20.05) 225(-0.25,20.05) 226(-0.75,20.05) 227(-1.25,20.05) 228(-1.75,20.05) 229(-2.25,20.05) 230(-2.75,20.05) 231(-3.25,20.05) 232(-3.75,20.05) 233(-4.25,20.05) 234(-4.75,20.05) 235(-5.25,20.05) 236(-5.75,20.05) 237(-6.25,20.05) 238(-6.75,20.05) 239(-7.25,20.05) 240(-7.75,20.05) 241(-8.25,20.05) 242(-8.75,20.05) 243(-9.25,20.05) 244(-9.75,20.05) 245(-10.25,20.05) 246(-10.75,20.05) 247(-11.25,20.05) 248(-11.75,20.05) 249(-12.25,20.05) 250(-12.75,20.05) 251(-13.25,20.05) 252(-13.75,20.05) 253(-14.25,20.05) 254(-14.75,20.05) 255(-15.25,20.05) 256(-15.75,20.05)
Top Overlay:
  lines w0.2: -18.3,-16.81 -18.3,-18.31 -16.8,-18.31 ; -18.3,16.59 -18.3,17.59 -17.6,18.29 -16.6,18.29 ; 16.8,-18.31 18.3,-18.31 18.3,-16.81 ; 16.8,18.29 18.3,18.29 18.3,16.79
  text "64" at -21.141,-18.048 h2
  text "256" at -19.2,19.542 h2
  text "129" at 18.74,-18.098 h2
  text "193" at 16.36,19.542 h2
  text "65" at -18.491,-20.998 h2
  text "128" at 16.44,-21.048 h2
  text "192" at 18.76,16.782 h2
Mechanical 5:
  region: -20.625,16.675 -20.375,16.425 -20.125,16.425 -19.875,16.675 -19.875,16.925 -20.125,17.175 -20.375,17.175 -20.625,16.925
  lines w0.1: -25,-25 25,-25 25,25 -25,25 -25,-25
  lines w0.2: -18.3,-18.31 18.3,-18.31 18.3,18.29 -16.3,18.29 -18.3,16.29 -18.3,-18.31
Mechanical 17:
  region: -19.875,16.925 -20.125,17.175 -20.375,17.175 -20.625,16.925 -20.625,16.675 -20.375,16.425 -20.125,16.425 -19.875,16.675
Mechanical 25:
  text "192" at 18.46,16.382 h2
  text "128" at 16.3,-20.5 h2
  text "65" at -18.4,-20.7 h2
  text "193" at 16.06,19.142 h2
  text "129" at 18.8,-17.6 h2
  text "256" at -19.5,19.142 h2
  text "64" at -20.9,-17.8 h2
3D body "5576xc7tfancort_1.step": height 3.15, standoff 0, extent -20.7,-20.7 20.7,20.7

## AX250(PQFP)_PP [mm]
pads (208):
  rect 1.6x0.3 smd: 1(-15,12.75) 2(-15,12.25) 3(-15,11.75) 4(-15,11.25) 5(-15,10.75) 6(-15,10.25) 7(-15,9.75) 8(-15,9.25) 9(-15,8.75) 10(-15,8.25) 11(-15,7.75) 12(-15,7.25) 13(-15,6.75) 14(-15,6.25) 15(-15,5.75) 16(-15,5.25) 17(-15,4.75) 18(-15,4.25) 19(-15,3.75) 20(-15,3.25) 21(-15,2.75) 22(-15,2.25) 23(-15,1.75) 24(-15,1.25) 25(-15,0.75) 26(-15,0.25) 27(-15,-0.25) 28(-15,-0.75) 29(-15,-1.25) 30(-15,-1.75) 31(-15,-2.25) 32(-15,-2.75) 33(-15,-3.25) 34(-15,-3.75) 35(-15,-4.25) 36(-15,-4.75) 37(-15,-5.25) 38(-15,-5.75) 39(-15,-6.25) 40(-15,-6.75) 41(-15,-7.25) 42(-15,-7.75) 43(-15,-8.25) 44(-15,-8.75) 45(-15,-9.25) 46(-15,-9.75) 47(-15,-10.25) 48(-15,-10.75) 49(-15,-11.25) 50(-15,-11.75) 51(-15,-12.25) 52(-15,-12.75) 105(15,-12.75) 106(15,-12.25) 107(15,-11.75) 108(15,-11.25) 109(15,-10.75) 110(15,-10.25) 111(15,-9.75) 112(15,-9.25) 113(15,-8.75) 114(15,-8.25) 115(15,-7.75) 116(15,-7.25) 117(15,-6.75) 118(15,-6.25) 119(15,-5.75) 120(15,-5.25) 121(15,-4.75) 122(15,-4.25) 123(15,-3.75) 124(15,-3.25) 125(15,-2.75) 126(15,-2.25) 127(15,-1.75) 128(15,-1.25) 129(15,-0.75) 130(15,-0.25) 131(15,0.25) 132(15,0.75) 133(15,1.25) 134(15,1.75) 135(15,2.25) 136(15,2.75) 137(15,3.25) 138(15,3.75) 139(15,4.25) 140(15,4.75) 141(15,5.25) 142(15,5.75) 143(15,6.25) 144(15,6.75) 145(15,7.25) 146(15,7.75) 147(15,8.25) 148(15,8.75) 149(15,9.25) 150(15,9.75) 151(15,10.25) 152(15,10.75) 153(15,11.25) 154(15,11.75) 155(15,12.25) 156(15,12.75)
  rect 0.3x1.6 smd: 53(-12.75,-15) 54(-12.25,-15) 55(-11.75,-15) 56(-11.25,-15) 57(-10.75,-15) 58(-10.25,-15) 59(-9.75,-15) 60(-9.25,-15) 61(-8.75,-15) 62(-8.25,-15) 63(-7.75,-15) 64(-7.25,-15) 65(-6.75,-15) 66(-6.25,-15) 67(-5.75,-15) 68(-5.25,-15) 69(-4.75,-15) 70(-4.25,-15) 71(-3.75,-15) 72(-3.25,-15) 73(-2.75,-15) 74(-2.25,-15) 75(-1.75,-15) 76(-1.25,-15) 77(-0.75,-15) 78(-0.25,-15) 79(0.25,-15) 80(0.75,-15) 81(1.25,-15) 82(1.75,-15) 83(2.25,-15) 84(2.75,-15) 85(3.25,-15) 86(3.75,-15) 87(4.25,-15) 88(4.75,-15) 89(5.25,-15) 90(5.75,-15) 91(6.25,-15) 92(6.75,-15) 93(7.25,-15) 94(7.75,-15) 95(8.25,-15) 96(8.75,-15) 97(9.25,-15) 98(9.75,-15) 99(10.25,-15) 100(10.75,-15) 101(11.25,-15) 102(11.75,-15) 103(12.25,-15) 104(12.75,-15) 157(12.75,15) 158(12.25,15) 159(11.75,15) 160(11.25,15) 161(10.75,15) 162(10.25,15) 163(9.75,15) 164(9.25,15) 165(8.75,15) 166(8.25,15) 167(7.75,15) 168(7.25,15) 169(6.75,15) 170(6.25,15) 171(5.75,15) 172(5.25,15) 173(4.75,15) 174(4.25,15) 175(3.75,15) 176(3.25,15) 177(2.75,15) 178(2.25,15) 179(1.75,15) 180(1.25,15) 181(0.75,15) 182(0.25,15) 183(-0.25,15) 184(-0.75,15) 185(-1.25,15) 186(-1.75,15) 187(-2.25,15) 188(-2.75,15) 189(-3.25,15) 190(-3.75,15) 191(-4.25,15) 192(-4.75,15) 193(-5.25,15) 194(-5.75,15) 195(-6.25,15) 196(-6.75,15) 197(-7.25,15) 198(-7.75,15) 199(-8.25,15) 200(-8.75,15) 201(-9.25,15) 202(-9.75,15) 203(-10.25,15) 204(-10.75,15) 205(-11.25,15) 206(-11.75,15) 207(-12.25,15) 208(-12.75,15)
Top Overlay:
  lines w0.2: -14.01,13.12 -14.01,13.54 -13.56,13.99 -13.14,13.99 ; -13.99,-14 -13.99,-13.12 ; -13.98,-13.99 -13.3,-13.99 ; 13.18,-14.02 13.98,-14.02 13.98,-13.29 ; 13.32,14 14.01,14 ; 13.99,13.31 13.99,13.99
  text "1" at -17.124,12.18 h0.94
  text "157" at 13.462,15.367 h0.94
  text "104" at 13.12,-17.028 h0.94
  text "53" at -15.391,-16.348 h0.94
  text "156" at 14.605,13.335 h0.94
  text "105" at 14.364,-14.66 h0.94
  text "208" at -15.621,15.24 h0.94
  text "52" at -18.241,-13.538 h0.94
Mechanical 5:
  circle w0.2: c-15.22,13.53 r0.25
  lines w0.2: -14.01,-14 13.98,-14.01 ; -14.01,12.79 -12.84,14 ; -14,12.75 -13.99,-14.01 ; -12.85,14 14.01,13.99 ; 13.97,-14.01 13.99,14.01
Mechanical 25:
  text "157" at 11.938,16.129 h2
  text "105" at 16.015,-13.39 h2
  text "53" at -15.137,-16.729 h2
  text "1" at -17.632,11.799 h2
  text "208" at -15.203,15.414 h2

## bti7 [mm] "44.3009.163.12"
height 2.5
pads (16):
  rect 2x0.65 smd: 1(-7.7,5) 2(-7.7,3.75) 3(-7.7,2.5) 4(-7.7,1.25) 5(-7.7,-1.25) 6(-7.7,-2.5) 7(-7.7,-3.75) 8(-7.7,-5) 9(7.7,-5) 10(7.7,-3.75) 11(7.7,-2.5) 12(7.7,-1.25) 13(7.7,1.25) 14(7.7,2.5) 15(7.7,3.75) 16(7.7,5)
Top Overlay:
  lines w0.2: -4.75,-6 -4.75,5.283 -4.033,6 4.75,6 4.75,-6 -4.75,-6
Mechanical 5:
  lines w0.2: -4.875,5 -7.75,5 -7.75,-5 -4.75,-5 ; 4.75,-5 8,-5 8,5 4.75,5
Mechanical 25:
  text "8" at -6.375,-5.375 h2
  text "9" at 5.625,-5.5 h2
  text "16" at 4.75,4.5 h2
  text "1" at -6.5,4.625 h2
3D body "bti7.stp": height 2.5, standoff 0, extent -8.15,-6 8.15,6